# Altium footprint library STM32F407.PcbLib: 54 footprints (part 2 of 4)
Each footprint in its own frame and in the unit in brackets; x right, y up, seen from the top. Pads: shape width x height; smd on the part's side, far side on the other; paste and mask are expansions set on the pad; w line width, h text height; cw(c..) or ccw(c..) is an arc to the next point about the centre after c.
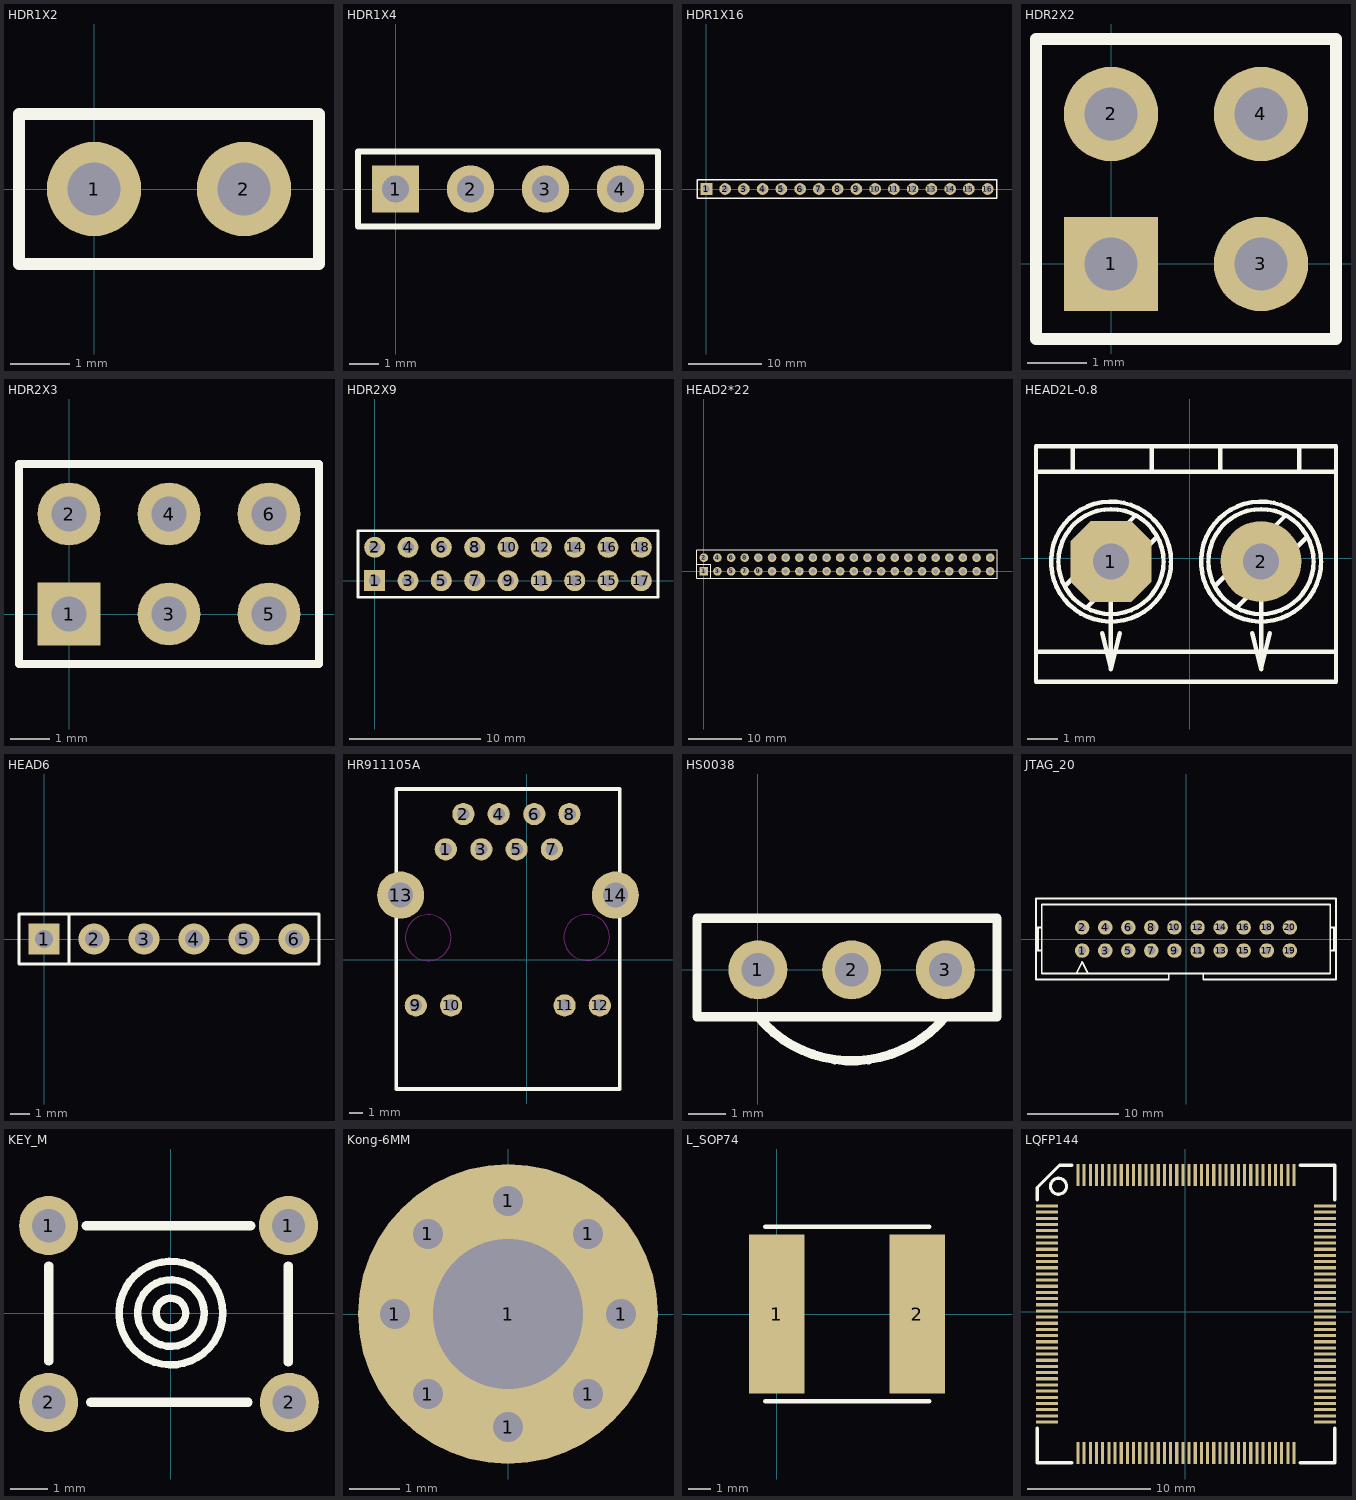
[diagram p1: the footprints below, top view; thin cyan lines are the x and y axes]

## HDR1X2 [mm]
pads (2):
  round 1.6 hole 0.9: 1(0,0) 2(2.54,0)
Top Overlay:
  lines w0.2: -1.27,-1.27 -1.27,1.27 3.81,1.27 3.81,-1.27 -1.27,-1.27
3D body "1001-2.STEP": height 8.54, standoff -3, extent -1.27,-1.27 3.81,1.27

## HDR1X4 [mm]
pads (4):
  rect 1.6x1.6 hole 0.9: 1(0,0)
  round 1.6 hole 0.9: 2(2.54,0) 3(5.08,0) 4(7.62,0)
Top Overlay:
  lines w0.2: -1.27,-1.27 8.89,-1.27 8.89,1.27 -1.27,1.27 -1.27,-1.27
3D body "Header_Male_4Pin.STEP": height 8.74, standoff -2.8, extent -1.27,-1.27 8.89,1.22

## HDR1X16 [mm]
pads (16):
  rect 1.6x1.6 hole 0.9: 1(0,0)
  round 1.6 hole 0.9: 2(2.54,0) 3(5.08,0) 4(7.62,0) 5(10.16,0) 6(12.7,0) 7(15.24,0) 8(17.78,0) 9(20.32,0) 10(22.86,0) 11(25.4,0) 12(27.94,0) 13(30.48,0) 14(33.02,0) 15(35.56,0) 16(38.1,0)
Top Overlay:
  lines w0.2: -1.27,-1.27 39.37,-1.27 39.37,1.27 0.635,1.27 -1.27,1.27 -1.27,-1.27
3D body "Header_Male_6Pin.STEP": height 8.74, standoff -2.8, extent 24.13,-1.22 39.37,1.27
3D body "Header_Male_6Pin.STEP": height 8.74, standoff -2.8, extent -1.27,-1.27 13.97,1.22
3D body "Header_Male_4Pin.STEP": height 8.74, standoff -2.8, extent 13.97,-1.22 24.13,1.27

## HDR2X2 [mm]
pads (4):
  rect 1.6x1.6 hole 0.9: 1(0,0)
  round 1.6 hole 0.9: 2(0,2.54) 3(2.54,0) 4(2.54,2.54)
Top Overlay:
  lines w0.2: -1.27,-1.27 3.81,-1.27 3.81,3.81 -1.27,3.81 -1.27,-1.27
3D body "User Library-PLD-4.step": height 8.54, standoff -3, extent -1.27,-1.27 3.81,3.81

## HDR2X3 [mm]
pads (6):
  rect 1.6x1.6 hole 0.9: 1(0,0)
  round 1.6 hole 0.9: 2(0,2.54) 3(2.54,0) 4(2.54,2.54) 5(5.08,0) 6(5.08,2.54)
Top Overlay:
  lines w0.2: 1.482,-1.27 6.35,-1.27 ; 6.35,-1.27 -1.27,-1.27 -1.27,3.81 6.35,3.81 6.35,-1.27
3D body "User Library-PLD-6.step": height 8.4, standoff -3, extent -1.27,-1.23 6.35,3.77

## HDR2X9 [mm]
pads (18):
  rect 1.6x1.6 hole 0.9: 1(0,0)
  round 1.6 hole 0.9: 2(0,2.54) 3(2.54,0) 4(2.54,2.54) 5(5.08,0) 6(5.08,2.54) 7(7.62,0) 8(7.62,2.54) 9(10.16,0) 10(10.16,2.54) 11(12.7,0) 12(12.7,2.54) 13(15.24,0) 14(15.24,2.54) 15(17.78,0) 16(17.78,2.54) 17(20.32,0) 18(20.32,2.54)
Top Overlay:
  lines w0.2: -1.27,-1.27 21.59,-1.27 21.59,3.81 -1.27,3.81 -1.27,-1.27
3D body "User Library-PLD-xx.step": height 8.4, standoff -3, extent -1.27,-1.23 21.59,3.77

## HEAD2*22 [mm]
pads (44):
  rect 1.6x1.6 hole 0.9: 1(0.011,0.011)
  round 1.6 hole 0.9: 2(0.011,2.551) 3(2.551,0.011) 4(2.551,2.551) 5(5.091,0.011) 6(5.091,2.551) 7(7.631,0.011) 8(7.631,2.551) 9(10.171,0.011) 10(10.171,2.551) 11(12.711,0.011) 12(12.711,2.551) 13(15.251,0.011) 14(15.251,2.551) 15(17.791,0.011) 16(17.791,2.551) 17(20.331,0.011) 18(20.331,2.551) 19(22.871,0.011) 20(22.871,2.551) 21(25.411,0.011) 22(25.411,2.551) 23(27.951,0.011) 24(27.951,2.551) 25(30.491,0.011) 26(30.491,2.551) 27(33.031,0.011) 28(33.031,2.551) 29(35.571,0.011) 30(35.571,2.551) 31(38.111,0.011) 32(38.111,2.551) 33(40.651,0.011) 34(40.651,2.551) 35(43.18,0) 36(43.18,2.54) 37(45.72,0) 38(45.72,2.54) 39(48.26,0) 40(48.26,2.54) 41(50.8,0) 42(50.8,2.54) 43(53.34,0) 44(53.34,2.54)
Top Overlay:
  lines w0.178: -1.259,1.3 1.3,1.3 1.3,-1.259 ; -1.259,-1.259 -1.259,3.821 -1.259,3.959 -1.218,4 54.61,4 54.61,-1.259 41.921,-1.259 -1.259,-1.259
3D body "User Library-PLD-4.step": height 8.54, standoff -3, extent -1.24,-1.24 3.84,3.84
3D body "User Library-PLD-xx.step": height 8.4, standoff -3, extent 3.835,-1.154 29.235,3.846
3D body "User Library-PLD-xx.step": height 8.4, standoff -3, extent 29.236,-1.154 54.636,3.846

## HEAD2L-0.8 [mm]
pads (2):
  oct 2.7x2.7 hole 1.2: 1(-2.631,-0.105)
  round 2.7 hole 1.2: 2(2.369,-0.105)
Top Overlay:
  circle w0.15: c2.369,-0.105 r2
  circle w0.15: c2.369,-0.105 r1.75
  circle w0.15: c-2.631,-0.105 r2
  circle w0.15: c-2.631,-0.105 r1.75
  lines w0.15: -5.131,-3.105 4.869,-3.105 ; -5.131,2.895 4.869,2.895 ; -4.144,-0.897 -1.833,1.415 ; -3.912,2.895 -3.912,3.734 ; -3.429,-1.626 -1.118,0.686 ; -2.921,-2.495 -2.631,-3.699 ; -2.631,-0.105 -2.631,-3.699 ; -2.341,-2.495 -2.631,-3.699 ; -1.27,2.895 -1.27,3.734 ; 0.856,-0.897 3.167,1.415 ; 1.008,2.895 1.008,3.734 ; 1.571,-1.626 3.882,0.686 ; 2.079,-2.495 2.369,-3.699 ; 2.369,-0.105 2.369,-3.699 ; 2.659,-2.495 2.369,-3.699 ; 3.65,2.895 3.65,3.734 ; -5.131,-4.105 4.869,-4.105 4.869,3.734 -5.131,3.734 -5.131,-4.105
3D body "User Library-CN_BT_1X2.step": height 10, standoff -2.28, extent -5.622,-3.955 4.878,3.745

## HEAD6 [mm]
pads (6):
  rect 1.6x1.6 hole 0.9: 1(0,0)
  round 1.6 hole 0.9: 2(2.54,0) 3(5.08,0) 4(7.62,0) 5(10.16,0) 6(12.7,0)
Top Overlay:
  lines w0.15: 1.27,-1.27 1.27,1.27 ; -1.27,-1.27 13.97,-1.27 13.97,1.27 -1.27,1.27 -1.27,-1.27
3D body "User Library-BL1-006-S842-55.step": height 8.42, standoff -3.2, extent -1.52,-1.27 14.22,1.27

## HR911105A [mm]
pads (14):
  round 1.6 hole 0.9: 1(-5.817,7.976) 2(-4.547,10.516) 3(-3.251,7.976) 4(-2.007,10.516) 5(-0.711,7.976) 6(0.559,10.516) 7(1.829,7.976) 8(3.099,10.516) 9(-7.976,-3.277) 10(-5.436,-3.277) 11(2.743,-3.277) 12(5.283,-3.277)
  round 3.4 hole 1.8: 13(-9.068,4.674) 14(6.401,4.674)
Top Overlay:
  lines w0.254: -9.398,-9.296 -9.398,12.319 6.731,12.319 6.731,-9.296 -9.398,-9.296
Keep-Out Layer:
  circle w0.051: c-7.088,1.6 r1.65
  circle w0.051: c4.342,1.626 r1.65
3D body "User Library-RMS-001L-08A0-GY.STEP": height 2.3, standoff -14.5, extent -9.269,-9.177 6.731,12.123

## HS0038 [mm]
pads (3):
  round 1.6 hole 0.9: 1(0,0) 2(2.54,0) 3(5.08,0)
Top Overlay:
  lines w0.254: 0,-1.27 ccw(c2.54,0.834) 5.08,-1.27 ; -1.651,-1.27 -1.651,1.397 6.477,1.397 6.477,-1.27 -1.651,-1.27

## JTAG_20 [mm]
pads (20):
  round 1.6 hole 0.9: 1(-11.43,-1.27) 2(-11.43,1.27) 3(-8.89,-1.27) 4(-8.89,1.27) 5(-6.35,-1.27) 6(-6.35,1.27) 7(-3.81,-1.27) 8(-3.81,1.27) 9(-1.27,-1.27) 10(-1.27,1.27) 11(1.27,-1.27) 12(1.27,1.27) 13(3.81,-1.27) 14(3.81,1.27) 15(6.35,-1.27) 16(6.35,1.27) 17(8.89,-1.27) 18(8.89,1.27) 19(11.43,-1.27) 20(11.43,1.27)
Top Overlay:
  lines w0.203: -16.51,-1.27 -15.875,-1.27 ; -16.51,1.27 -15.875,1.27 ; -16.298,-1.27 -16.298,1.27 ; -12.065,-3.81 -11.43,-2.54 -10.795,-3.81 ; -8.625,-4.445 -1.905,-4.445 -1.905,-3.81 ; -8.255,-4.445 -16.51,-4.445 -16.51,4.445 16.51,4.445 16.51,-4.445 8.255,-4.445 1.905,-4.445 1.905,-3.81 ; 15.875,-1.27 16.51,-1.27 ; 15.875,1.27 16.51,1.27 ; 16.298,-1.27 16.298,1.27 ; -1.905,-3.81 -15.875,-3.81 -15.875,3.81 15.875,3.81 15.875,-3.81 1.905,-3.81 ; -1.905,-3.81 1.905,-3.81
3D body "SW3dPS-PinBox Connector_20Pin.STEP": height 10.9, standoff -3, extent -16.439,-4.451 16.561,4.349

## KEY_M [mm]
pads (4):
  round 1.6 hole 0.9: 1(-3.302,2.362) 1(3.175,2.362) 2(-3.302,-2.413) 2(3.2,-2.413)
Top Overlay:
  circle w0.2: c0,0 r1.4
  circle w0.2: c0,0 r0.9
  circle w0.2: c0,0 r0.4
  lines w0.254: -3.302,-1.295 -3.302,1.27 ; -2.286,2.362 2.16,2.362 ; -2.159,-2.413 2.083,-2.413 ; 3.175,-1.321 3.175,1.27
3D body "4pin_TS-1143-WP.STEP": height 4.3, standoff -3.5, extent -4.175,-3.27 4.092,3.23

## Kong-6MM [mm]
pads (9):
  round 0.6 hole 0.6: 1(-2.261,0) 1(-1.6,-1.6) 1(-1.6,1.6) 1(0,-2.261) 1(0,2.261) 1(1.6,-1.6) 1(1.6,1.6) 1(2.261,0)
  round 6 hole 3: 1(0,0)

## L_SOP74 [mm]
pads (2):
  rect 2.5x7.2 smd: 1(0,0) 2(6.35,0)
Top Overlay:
  lines w0.203: -0.508,-3.937 6.892,-3.937 ; -0.508,3.937 6.892,3.937
3D body "SUMIDA-CDRH6D28.STEP": height 2.9, standoff 0, extent -0.16,-3.33 6.54,3.37

## LQFP144 [mm]
pads (144):
  rect 1.8x0.254 smd: 1(-11.185,8.56) 2(-11.185,8.06) 3(-11.185,7.56) 4(-11.185,7.06) 5(-11.185,6.56) 6(-11.185,6.06) 7(-11.185,5.56) 8(-11.185,5.06) 9(-11.185,4.56) 10(-11.185,4.06) 11(-11.185,3.56) 12(-11.185,3.06) 13(-11.185,2.56) 14(-11.185,2.06) 15(-11.185,1.56) 16(-11.185,1.06) 17(-11.185,0.56) 18(-11.185,0.06) 19(-11.185,-0.44) 20(-11.185,-0.94) 21(-11.185,-1.44) 22(-11.185,-1.94) 23(-11.185,-2.44) 24(-11.185,-2.94) 25(-11.185,-3.44) 26(-11.185,-3.94) 27(-11.185,-4.44) 28(-11.185,-4.94) 29(-11.185,-5.44) 30(-11.185,-5.94) 31(-11.185,-6.44) 32(-11.185,-6.94) 33(-11.185,-7.44) 34(-11.185,-7.94) 35(-11.185,-8.44) 36(-11.185,-8.94) 73(11.315,-8.94) 74(11.315,-8.44) 75(11.315,-7.94) 76(11.315,-7.44) 77(11.315,-6.94) 78(11.315,-6.44) 79(11.315,-5.94) 80(11.315,-5.44) 81(11.315,-4.94) 82(11.315,-4.44) 83(11.315,-3.94) 84(11.315,-3.44) 85(11.315,-2.94) 86(11.315,-2.44) 87(11.315,-1.94) 88(11.315,-1.44) 89(11.315,-0.94) 90(11.315,-0.44) 91(11.315,0.06) 92(11.315,0.56) 93(11.315,1.06) 94(11.315,1.56) 95(11.315,2.06) 96(11.315,2.56) 97(11.315,3.06) 98(11.315,3.56) 99(11.315,4.06) 100(11.315,4.56) 101(11.315,5.06) 102(11.315,5.56) 103(11.315,6.06) 104(11.315,6.56) 105(11.315,7.06) 106(11.315,7.56) 107(11.315,8.06) 108(11.315,8.56)
  rect 0.254x1.8 smd: 37(-8.685,-11.44) 38(-8.185,-11.44) 39(-7.685,-11.44) 40(-7.185,-11.44) 41(-6.685,-11.44) 42(-6.185,-11.44) 43(-5.685,-11.44) 44(-5.185,-11.44) 45(-4.685,-11.44) 46(-4.185,-11.44) 47(-3.685,-11.44) 48(-3.185,-11.44) 49(-2.685,-11.44) 50(-2.185,-11.44) 51(-1.685,-11.44) 52(-1.185,-11.44) 53(-0.685,-11.44) 54(-0.185,-11.44) 55(0.315,-11.44) 56(0.815,-11.44) 57(1.315,-11.44) 58(1.815,-11.44) 59(2.315,-11.44) 60(2.815,-11.44) 61(3.315,-11.44) 62(3.815,-11.44) 63(4.315,-11.44) 64(4.815,-11.44) 65(5.315,-11.44) 66(5.815,-11.44) 67(6.315,-11.44) 68(6.815,-11.44) 69(7.315,-11.44) 70(7.815,-11.44) 71(8.315,-11.44) 72(8.815,-11.44) 109(8.815,11.06) 110(8.315,11.06) 111(7.815,11.06) 112(7.315,11.06) 113(6.815,11.06) 114(6.315,11.06) 115(5.815,11.06) 116(5.315,11.06) 117(4.815,11.06) 118(4.315,11.06) 119(3.815,11.06) 120(3.315,11.06) 121(2.815,11.06) 122(2.315,11.06) 123(1.815,11.06) 124(1.315,11.06) 125(0.815,11.06) 126(0.315,11.06) 127(-0.185,11.06) 128(-0.685,11.06) 129(-1.185,11.06) 130(-1.685,11.06) 131(-2.185,11.06) 132(-2.685,11.06) 133(-3.185,11.06) 134(-3.685,11.06) 135(-4.185,11.06) 136(-4.685,11.06) 137(-5.185,11.06) 138(-5.685,11.06) 139(-6.185,11.06) 140(-6.685,11.06) 141(-7.185,11.06) 142(-7.685,11.06) 143(-8.185,11.06) 144(-8.685,11.06)
Top Overlay:
  circle w0.254: c-10.262,10.16 r0.65
  lines w0.254: -11.985,-9.423 -11.985,-12.24 -9.169,-12.24 ; -11.985,9.042 -11.985,10.062 -10.187,11.86 -9.169,11.86 ; 9.296,-12.24 12.115,-12.24 12.115,-9.423 ; 9.296,11.86 12.115,11.86 12.115,9.042
3D body "LQFP144.STEP": height 1.71, standoff 0.14, extent -10.82,-11.074 10.952,10.698